# Altium schematic symbol library Hydra_Ref_sch.SCHLIB: 791 symbols (part 2 of 5) (continued)
## LSD0-05620
designator L?, comment value 6.2uH  (hidden comment: IND; 6.2uH;20%;4.96uH@2.43A;.023 OHM;PARALLEL;.39X.39X.195H)
MFGR: BH ELECTRONICS; NoLoad: .; Approved: CL; G_PN: LSD0-05620; M_PN: L11-1012; level: 1; ModifyDate: 5/2/13; item_number: LSD0-05620
footprint L11_BH ELECTRONICS (Footprint not found)
footprint L11_BH_ELECTRONICS
pins: 1 Pri+, 2 Pri-, 3 Sec-, 4 Sec+

## LSD0-05739
designator L?, comment value 7.39uH  (hidden comment: IND;7.39uH;20%;5.9uH@5.09A;.036 OHM;PARALLEL;.5X.5X.25H)
MFGR: BH ELECTRONICS; NoLoad: .; Approved: CL; G_PN: LSD0-05739; M_PN: L10-1012; level: 1; ModifyDate: 4/29/13; item_number: LSD0-05739
footprint L10_BH ELECTRONICS (Footprint not found)
footprint L10_BH_ELECTRONICS
pins: 1 Pri+, 2 Pri-, 3 Sec-, 4 Sec+

## LSD0-05848
designator L?, comment value 8.48uH  (hidden comment: IND;8.48uH;20%;6.8uH@4.75A;.019 OHM;PARALLEL; .5X.5X.25H)
MFGR: BH ELECTRONICS; NoLoad: .; Approved: CL; G_PN: LSD0-05848; M_PN: L01-0726; level: 1; ModifyDate: 5/1/13; item_number: LSD0-05848
footprint L10_BH ELECTRONICS (Footprint not found)
footprint L10_BH_ELECTRONICS
pins: 1 Pri+, 2 Pri-, 3 Sec-, 4 Sec+

## LSD0-05893
designator L?, comment value 8.93uH  (hidden comment: IND; 8.93uH;20%;7.14uH@2.03A;.034 OHM;PARALLEL;.39X.39X.195H)
MFGR: BH ELECTRONICS; NoLoad: .; Approved: CL; G_PN: LSD0-05893; M_PN: L11-1013; level: 1; ModifyDate: 4/29/13; item_number: LSD0-05893
footprint L11_BH ELECTRONICS (Footprint not found)
footprint L11_BH_ELECTRONICS
pins: 1 Pri+, 2 Pri-, 3 Sec-, 4 Sec+

## LSD0-05939
designator L?, comment value 59.39uH  (hidden comment: IND; 59.39uH;20%;47.51uH@1A;.623 OHM;PARALLEL;.305X.305X.15H)
MFGR: BH ELECTRONICS; NoLoad: .; Approved: CL; G_PN: LSD0-05939; M_PN: L16-1033; level: 1; ModifyDate: 5/8/13; item_number: LSD0-05939
footprint L16_BH ELECTRONICS (Footprint not found)
footprint L16_BH_ELECTRONICS
pins: 1 Pri+, 2 Pri-, 3 Sec-, 4 Sec+

## LSD0-05980
designator L?, comment value 9.8uH  (hidden comment: IND; 9.8uH;20%;7.84uH@2.47A;.102 OHM;PARALLEL;.305X.305X.15H)
MFGR: BH ELECTRONICS; NoLoad: .; Approved: CL; G_PN: LSD0-05980; M_PN: L16-1014; level: 1; ModifyDate: 4/30/13; item_number: LSD0-05980
footprint L16_BH ELECTRONICS (Footprint not found)
footprint L16_BH_ELECTRONICS
pins: 1 Pri+, 2 Pri-, 3 Sec-, 4 Sec+

## LSD0-07770
designator T?, comment CHOKE;CM;770UH;35%;4.7A;.04 DCR;3MHZ SRF;.67X.77 LCCI-50 SMT  (value not drawn)
Approved: FRANK; G_PN: LSD0-07770; M_PN: P0422NL; MFGR: Pulse Eng Inc.; level: 1; ModifyDate: 12/10/12; NoLoad: *; item_number: LSD0-07770
footprint IND-17.02X19.56-4P (ND-17.02X19.56-4P)
pins: 1, 2, 3, 4

## LSD2-06470
designator L?, comment value 47uH  (hidden comment: INDUCTOR;47UH;20%;3.0;.05 OHM;.669L X.701WX.441H;TOROID;SMT)
MFGR: AlphaMag; NoLoad: .; Approved: CL; G_PN: LSD2-06470; M_PN: SH50S-3.0-47; level: 1; ModifyDate: 5/2/12; item_number: LSD2-06470
footprint IND-SH50S (.135x.050 toroidan inductor G_PN 34345)
pins: 1, 2

## LSD2-06500
designator L?, comment value 50uH  (hidden comment: INDUCTOR;50UH;20%;1.65A;.121 OHM;.5L X.5WX.215H;TOROID;SMT)
MFGR: PULSE; NoLoad: .; Approved: CL; G_PN: LSD2-06500; M_PN: P0147NL; level: 1; ModifyDate: 5/2/12; item_number: LSD2-06500
footprint IND-P0147 (.500X.500x..215" toroidan inductor G_PN LSD2-06500)
pins: 1, 2

## LTP0-S0002
designator T?, comment M_PN: PA0805NL  (hidden comment: ANSFORMER;POWER;200KHZ-700KHZ;140W;SMT .92INX.85IN)
NoLoad: .; MFGR: Pulse Eng; Approved: NM; G_PN: LTP0-S0002; level: 1; ModifyDate: 10/24/12; item_number: LTP0-S0002
footprint XFMR-PA0808 (.920x.850x.339" 11Pins SMT Transformer -Pulse)
pins: 2 PriA+, 3 PriB+, 4 PriA-, 5 PriB-, 7 Sec+, 8 SecCT, 9 SecCT, 10 SecCT, 11 Sec-
text: 1T; PRI A; PRI B

## LTR0-00108
designator T?, comment G_PN: LTR0-00108  (hidden comment: XFMER; .1-130MHZ; Z 1:8; .31 X .22; SMT)
M_PN: ADT8-1T+; NoLoad: .; MFGR: MINICIRCUITS; Approved: CL; Value: ADT8-1T+; level: 1; ModifyDate: 4/11/12; item_number: LTR0-00108
footprint XFMR-CD637 (.220x.310x.206" 6Pins RF Transformer -Mini-Circuits)
pins: 1 Pri+, 3 Pri-, 4 Sec-, 5 SecCT, 6 Sec+

## LTR1-S0102
designator T?, comment G_PN: LTR1-S0102  (hidden comment: XFORMER;1:2Z CT;8-600 MHZ;1W;30MA;CD542 CASE)
M_PN: ADT2-1T-1P+; NoLoad: .; MFGR: MINICIRCUITS; Approved: NM; Value: ADT2-1T-1P+; level: 1; ModifyDate: 11/9/12; item_number: LTR1-S0102
footprint XFMR-CD542 (.220x.310x.212" 6Pins RF Transformer -Mini-Circuits)
pins: 1 Pri+, 3 Pri-, 4 Sec-, 5 SecCT, 6 Sec+

## LTR2-S0104
designator T?, comment G_PN: LTR2-S0104  (hidden comment: XFORMER;1:4Z CT;1.5-600 MHZ; .25W;30MA;DB714 CASE)
M_PN: TCM4-6T+; NoLoad: .; MFGR: MINICIRCUITS; Approved: CL; Value: TCM4-6T+; level: 1; ModifyDate: 2/25/13; item_number: LTR2-S0104
footprint CPLR-DB714 (.150x.160x.160" 6pin Derectional Coupler- Mini-Circuit)
pins: 1 Pri+, 2 SecCT, 3 Pri-, 4 Sec-, 6 Sec+

## LTR3-S0104
designator T?, comment G_PN: LTR3-S0104  (hidden comment: XFORMER;1:4Z CT;500-2500MHZ; .25W;30MA;.15INx.15IN)
M_PN: TC4-25+; NoLoad: .; MFGR: MINICIRCUITS; Approved: CL; Value: TC4-25+; level: 1; ModifyDate: 2/25/13; item_number: LTR3-S0104
footprint AT224-1 (Footprint not found)
pins: 1 Sec, 2 Sec CT, 3 Sec Dot, 4 Pri , 6 Pri Dot

## LTR4-S0104
designator T?, comment G_PN: LTR4-S0104  (hidden comment: XFORMER;1:4Z CT;2-800MHZ; .25W;240MA;.15INx.15IN)
M_PN: MABAES0061; NoLoad: .; MFGR: MACOM TECH; Approved: CL; Value: MABAES0061; level: 1; ModifyDate: 6/1/13; item_number: LTR4-S0104
footprint SM-22_Macomtech (SM-22 Package; 150 X 150 MIL)
pins: 1 Pri+, 2 SecCT, 3 Pri-, 4 Sec-, 5 Sec+

## MA08-20002
designator U?, comment M_PN: MSA-0505  (hidden comment: AMP;100-1500MHZ;7.5DB;+18DBM;8.4V;80MA;6.5DB NF;05 PKG)
NoLoad: .; Approved: CL; MFGR: AVAGO; G_PN: MA08-20002; level: 1; ModifyDate: 02/22/12; Value: MSA-0505; item_number: MA08-20002
footprint AMP-AVAGO-05 (05 Plastic Package - Avago)
pins: 1 IN, 2 GND, 3 OUT, 4 GND

## MA09-10002
designator U?, comment G_PN: MA09-10002  (hidden comment: AMP;100-1500MHZ;8.5DB;+23DBM;12V;165MA;6.5DB NF;.2 BeO PKG)
NoLoad: .; Approved: CL; MFGR: AVAGO; level: 1; M_PN: MSA-0520; ModifyDate: 02/22/12; Value: MSA-0520; item_number: MA09-10002
footprint AMP-AVAGO-200mil Be0-SMT (200mil Be0 Package Dimensions - Avago)
footprint AMP-AVAGO-200mil_Be0-SMT
pins: 1 IN, 2 GND, 3 OUT, 4 GND

## MA10-00004
designator U?, comment M_PN: RF3861  (hidden comment: P;.4-3.8GHZ;+22DBM;5V;90MA;QFN-16)
MFGR: RFMD; Approved: CL; G_PN: MA10-00004; Value: RF3861; NoLoad: .; level: 1; ModifyDate: 3/7/13; item_number: MA10-00004
footprint QFN-16_RFMD (QFN-16 RFMD)
pins: 1 NC, 2 NC, 3 RF IN, 4 NC, 5 NC, 6 NC, 7 AGC, 8 NC, 9 NC, 10 NC, 11 RF OUT, 12 NC, 13 NC, 14 NC, 15 NC, 16 NC, 17 GND

## MA12-10001
designator U?, comment G_PN: MA12-10001  (hidden comment: AMP;50-1000MHZ;12DB;+18DBM;5.5V;60MA;4.4DB NF;RRR137 PKG)
M_PN: MAV-11BSM+; NoLoad: .; Approved: CL; MFGR: MINI-CIRCUITS; Value: MAV-11BSM+; level: 1; ModifyDate: 5/24/13; item_number: MA12-10001
footprint RRR137
pins: 1 IN, 2 GND, 3 OUT, 4 GND

## MA13-06289
designator U?, comment M_PN: SGA6289Z  (hidden comment: AMP;0-4500MHZ;20DB;+13DBM;5V;75MA;4.0DB NF;SOT-89)
Value: SGA6289Z; NoLoad: .; Approved: CL; MFGR: RFMD; G_PN: MA13-06289; level: 1; ModifyDate: 2/28/13; item_number: MA13-06289
footprint SOT-89 (Pins 2 and 4 connected to GND)
pins: 1 IN, 2 GND, 3 OUT, 4 GND

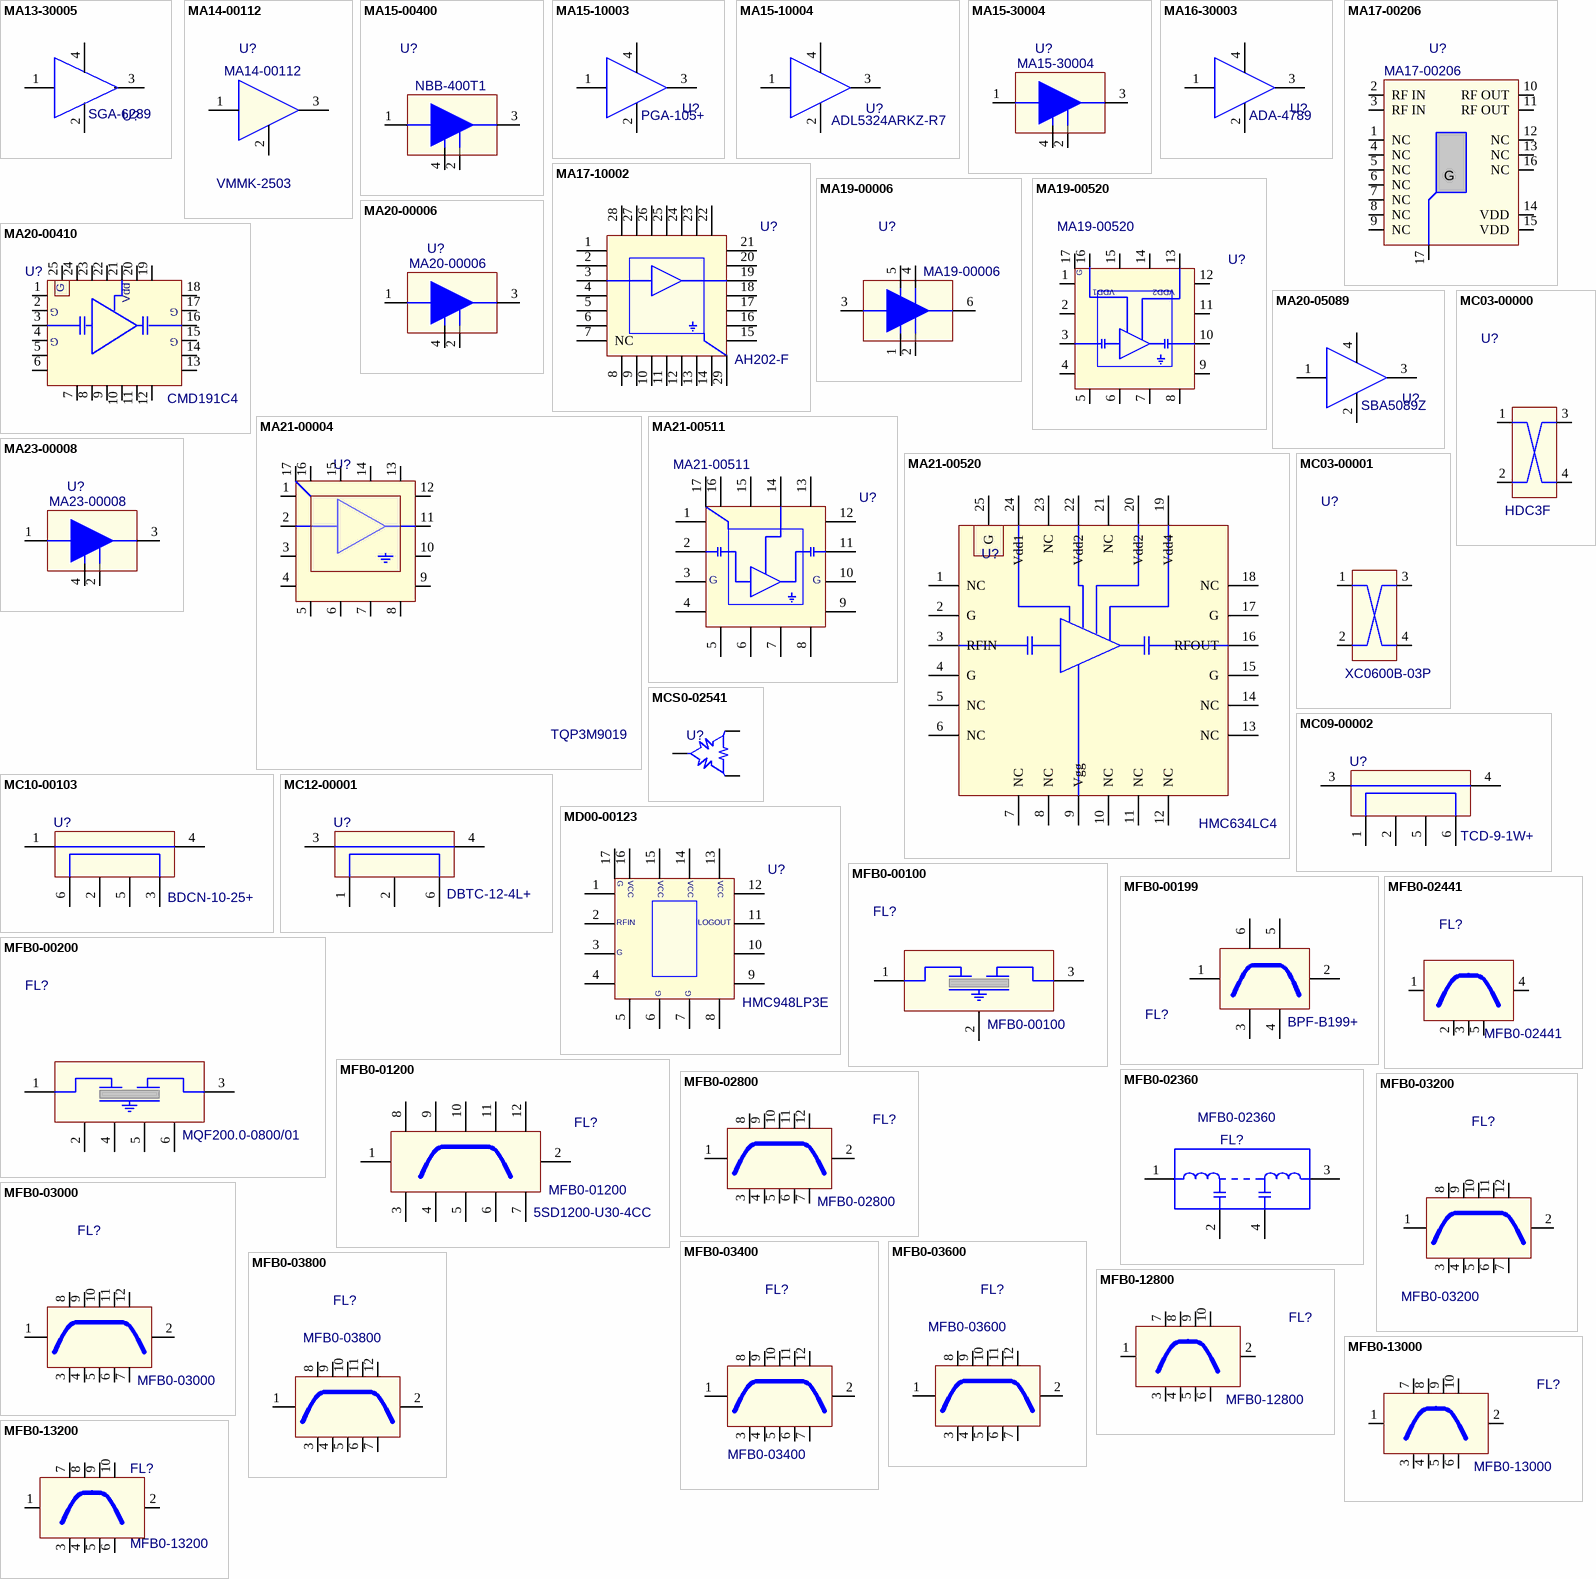
[diagram p8: symbols MA13-30005 to MFB0-13200]

## MA13-30005
designator U?, comment SGA-6289
AMP;0-5.5GHZ;16DB;+18DBM;75MA;SOT-89; G_PN: MA13-30005; NoLoad: .; Approved: CL; level: 1; Value: SGA-6289; ModifyDate: 4/11/12; M_PN: SGA-6289; item_number: MA13-30005
footprint SOT89L
pins: 1 IN, 2 GND, 3 OUT, 4 GND

## MA14-00112
designator U?, comment M_PN: VMMK-2503  G_PN: MA14-00112  (hidden comment: AMP;1-12GHz;13.5dB;+17dBm;5V;68mA;WLP-0402)
NoLoad: .; Approved: NM; MFGR: AVAGO; level: 1; ModifyDate: 11/28/12; item_number: MA14-00112
footprint AMP-VMMK-2503 (0.5x1.05x0.25mm)
pins: 1 IN, 2 GND, 3 OUT

## MA15-00400
designator U?, comment M_PN: NBB-400T1  (hidden comment: AMP;0-8000MHZ;15DB;+15DBM;3.9V;47MA;4.3DB NF;MICRO-X)
Approved: CL; G_PN: MA15-00400; MFGR: RFMD; Value: NBB-400T1; level: 1; ModifyDate: 3/9/13; item_number: MA15-00400
footprint AMP-NBB-400 (Check the PCB symbol when sample arive)
pins: 1, 2 GND, 3, 4

## MA15-10003
designator U?, comment M_PN: PGA-105+  (hidden comment: AMP.04-2.6GHZ;+19DBM;5V;63MA;SOT-89)
Value: PGA-105+; NoLoad: .; Approved: CL; MFGR: MINI-CIRCUITS; G_PN: MA15-10003; level: 1; ModifyDate: 10-22-13; item_number: MA15-10003
footprint SOT-89 (Pins 2 and 4 connected to GND)
pins: 1 IN, 2 GND, 3 OUT, 4 GND

## MA15-10004
designator U?, comment M_PN: ADL5324ARKZ-R7  (hidden comment: AMP;.4-4GHz;15dB;+29dBm;5V;133mA;SOT-89)
Value: ADL5324ARKZ-R7; NoLoad: .; Approved: CL; MFGR: ANALOG; G_PN: MA15-10004; level: 1; ModifyDate: 8/8/14; item_number: MA15-10004
footprint SOT-89 (Pins 2 and 4 connected to GND)
pins: 1 IN, 2 GND, 3 OUT, 4 GND

## MA15-30004
designator U?, comment G_PN: MA15-30004  (hidden comment: AMP;0-4GHZ;15DB;+24DBM;7.3V;120MA;SOT-89)
Approved: CL; MFGR: Triquint; NoLoad: .; Value: ECG008B-G; level: 1; ModifyDate: 3/30/16; M_PN: ECG008B-G; item_number: MA15-30004
footprint SOT-89 (Pins 2 and 4 connected to GND)
pins: 1, 2 GND, 3, 4

## MA16-30003
designator U?, comment M_PN: ADA-4789  (hidden comment: AMP;.01-2.5GHz;17DB;+17DBM;3.85V;60MA)
NoLoad: .; Approved: CL; MFGR: AVAGO; G_PN: MA16-30003; level: 1; Value: ADA-4789; ModifyDate: 4/12/12; item_number: MA16-30003
footprint SOT89L (SOT89, 3-Leads, Body 4.5x2.4 mm, Pitch 1.5mm, Lead Span 4.1mm, IPC High Density)
pins: 1 IN, 2 GND, 3 OUT, 4 GND

## MA17-00206
designator U?, comment G_PN: MA17-00206  (hidden comment: MMA-020624-L3)
AMP;2-6GHz;17DB;+25DBM;9V;250MA;LLC-17; MFGR: MICROWAVE TECH; NoLoad: .; Approved: NM; level: 1; Value: *; ModifyDate: 11/14/12; M_PN: MMA-020624-L3; item_number: MA17-00206
footprint QFN50P300x300x110-17N (QFN-16PIN-3MMx3MM_.5mm Pitch .8 mm tall Nominal footprint)
pins: 1 NC, 2 RF IN, 3 RF IN, 4 NC, 5 NC, 6 NC, 7 NC, 8 NC, 9 NC, 10 RF OUT, 11 RF OUT, 12 NC, 13 NC, 14 VDD, 15 VDD, 16 NC, 17 GND
text: G

## MA17-10002
designator U?, comment M_PN: AH202-F  (hidden comment: AMP;.05-2.2GHZ;+30DBM;11V;330MA;QFN-28 W/G)
MFGR: TRIQUINT; Approved: CL; G_PN: MA17-10002; Value: AHA202-F; NoLoad: .; level: 1; ModifyDate: 4/1/12; item_number: MA17-10002
footprint QFN65P600X600X100-29 (QFN, 28-Leads, Body 6.0x6.0mm (max), Pitch 0.65mm, TRIQUINT)
pins: 1 GND, 2 GND, 3 In, 4 GND, 5 GND, 6 GND, 7 NC, 8 GND, 9 GND, 10 GND, 11 GND, 12 GND, 13 GND, 14 GND, 15 GND, 16 GND, 17 GND, 18 GND, 19 GND, 20 GND, 21 GND, 22 GND, 23 GND, 24 GND, 25 GND, 26 GND, 27 GND, 28 GND, 29 GND

## MA19-00006
designator U?, comment G_PN: MA19-00006  (hidden comment: AMP;0-6GHZ;19.6DB;+12.9DBM;5V;SOT-363)
Approved: CL; MFGR: AVAGO; NoLoad: .; Value: AVT-51663; level: 1; ModifyDate: 3/6/13; M_PN: AVT-51663; item_number: MA19-00006
footprint SOT-363 (JEDEC MO-203AB)
pins: 1  , 2  , 3  , 4  , 5  , 6   

## MA19-00520
designator U?, comment G_PN: MA19-00520  (hidden comment: AMP;5-11GHz;21dB;+19dBm;5V;114mA;LC3)
MFGR: HITTITE; Approved: CL; Value: HMC451LC3; NoLoad: .; level: 1; ModifyDate: 1/25/13; M_PN: HMC451LC3; item_number: MA19-00520
footprint QFN-16_HITTITE_LC3_036 (LC3 – 3 x 3 mm QFN CERAMIC  HIGH FREQUENCY SMT PACKAGE, 36mil height)
pins: 1 NC, 2 NC, 3 RF IN, 4 NC, 5 NC, 6 NC, 7 NC, 8 NC, 9 NC, 10 RF OUT, 11 NC, 12 NC, 13 VDD2, 14 NC, 15 NC, 16 VDD1, 17 GND
text: G

## MA20-00006
designator U?, comment G_PN: MA20-00006  (hidden comment: AMP;0-6GHZ;20DB;+20DBM;5V;100MA;SOT-89)
Approved: CL; MFGR: SKYWORKS; NoLoad: .; Value: SKY65017-70LF; level: 1; ModifyDate: 6/26/14; M_PN: SKY65017-70LF; item_number: MA20-00006
footprint SOT-89 (Pins 2 and 4 connected to GND)
pins: 1, 2 GND, 3, 4

## MA20-00410
designator U?, comment M_PN: CMD191C4  (hidden comment: AMP;.4-10GHZ ;+20DBM;5V;123MA;QFN-24)
Value: CMD191C4; NoLoad: .; Approved: CL; MFGR: CUSTOM MMIC; G_PN: MA20-00410; level: 1; ModifyDate: 1/15/14; item_number: MA20-00410
footprint QFN-24_C-MMIC (Footprint not found)
pins: 1 NC, 2 G, 3 RFIN, 4 G, 5 NC, 6 NC, 7 NC, 8 NC, 9 NC, 10 NC, 11 NC, 12 NC, 13 NC, 14 NC, 15 G, 16 RFOUT, 17 G, 18 NC, 19 NC, 20 NC, 21 Vdd, 22 NC, 23 NC, 24 NC, 25 G

## MA20-05089
designator U?, comment M_PN: SBA5089Z  (hidden comment: AMP;0-5000MHZ;20DB;+19.5DBM;5V;80MA;4.5DB NF;SOT-89)
Value: SBA5089Z; NoLoad: .; Approved: CL; MFGR: RFMD; G_PN: MA20-05089; level: 1; ModifyDate: 2/28/13; item_number: MA20-05089
footprint SOT-89 (Pins 2 and 4 connected to GND)
pins: 1 IN, 2 GND, 3 OUT, 4 GND

## MA21-00004
designator U?, comment M_PN: TQP3M9019  (hidden comment: AMP;.05-4GHz;21dB;+22dBm;5V;150mA;QFN16)
Value: TQP3M9019; NoLoad: .; Approved: CL; MFGR: TRIQUINT; G_PN: MA21-00004; level: 1; ModifyDate: 3/11/13; item_number: MA21-00004
footprint QFN-16_TRIQUINT (QFN-16 TRIQUINT)
pins: 1 NC, 2 RFIN, 3 NC, 4 NC, 5 NC, 6 NC, 7 NC, 8 NC, 9 NC, 10 NC, 11 RFOUT, 12 NC, 13 NC, 14 NC, 15 NC, 16 NC, 17 G

## MA21-00511
designator U?, comment G_PN: MA21-00511  (hidden comment: AMP;5-11GHz;21dB;+10dBm;3.6V;30mA;QFN-16)
MFGR: CUSTOM MMIC; Approved: CL; Value: CMD132P3; NoLoad: .; level: 1; ModifyDate: 6/6/13; M_PN: CMD132P3; item_number: MA21-00511
footprint QFN-16_C-MMIC (QFN-16 C-MMIC)
pins: 1 NC, 2 RF IN, 3 GND, 4 NC, 5 NC, 6 NC, 7 NC, 8 NC, 9 NC, 10 GND, 11 RF OUT, 12 NC, 13 NC, 14 Vdd, 15 NC, 16 NC, 17 GND
text: G

## MA21-00520
designator U?, comment M_PN: HMC634LC4  (hidden comment: AMP;5-20GHz;21dB;+22dBm;5V;180mA;QFN24)
Value: HMC634LC4; NoLoad: .; Approved: CL; MFGR: HITTITE; G_PN: MA21-00520; level: 1; ModifyDate: 2/26/13; item_number: MA21-00520
footprint LC4_HITTITE (QFN Plastic Package 157X157X40(mil))
pins: 1 NC, 2 G, 3 RFIN, 4 G, 5 NC, 6 NC, 7 NC, 8 NC, 9 Vgg, 10 NC, 11 NC, 12 NC, 13 NC, 14 NC, 15 G, 16 RFOUT, 17 G, 18 NC, 19 Vdd4, 20 Vdd2, 21 NC, 22 Vdd2, 23 NC, 24 Vdd1, 25 G

## MA23-00008
designator U?, comment G_PN: MA23-00008  (hidden comment: AMP;0-8GHZ;23DB;+18DBM;5V;70MA;SOT-89)
Approved: NM; MFGR: MIMIX BROADBAND; NoLoad: .; Value: CGB7017-SC; level: 1; ModifyDate: 11/14/12; M_PN: CGB7017-SC; item_number: MA23-00008
footprint SOT-89 (Pins 2 and 4 connected to GND)
pins: 1, 2 GND, 3, 4

## MC03-00000
designator U?, comment M_PN: HDC3F  (hidden comment: COUPLER;3DB;90 DEG;380-520 MHZ;3.6DB LOSS;56INx.35IN SMT CASE)
MFGR: ANAREN; NoLoad: .; Approved: CL; Value: HDC3F; G_PN: MC03-00000; level: 1; ModifyDate: 3/15/13; item_number: MC03-00000
footprint HDC3F (Footprint not found)
pins: 1  , 2  , 3  , 4  

## MC03-00001
designator U?, comment M_PN: XC0600B-03P  (hidden comment: COUPLER;3DB;90 DEG;250-1000 MHZ;3.6DB LOSS;1INx.5IN SMT CASE)
MFGR: ANAREN; NoLoad: .; Approved: CL; Value: XC0600B-03P; G_PN: MC03-00001; level: 1; ModifyDate: 3/12/13; item_number: MC03-00001
footprint XC0600B-03P (Footprint not found)
pins: 1  , 2  , 3  , 4  

## MC09-00002
designator U?, comment M_PN: TCD-9-1W+  (hidden comment: COUPLER;8.9DB;5-2000 MHZ;1.2DB LOSS;DB714 SMT CASE)
MFGR: MINI_CIRCUITS; NoLoad: .; Approved: CL; Value: TCD-9-1W+; G_PN: MC09-00002; level: 1; ModifyDate: 5/18/12; item_number: MC09-00002
footprint CPLR-DB714 (.150x.160x.160" 6pin Derectional Coupler- Mini-Circuit)
pins: 1, 2, 3, 4, 5, 6

## MC10-00103
designator U?, comment M_PN: BDCN-10-25+  (hidden comment: COUPLER;10DB;820-2525 MHZ;1.5DB LOSS;FV1206-1 SMT CASE)
MFGR: MINI_CIRCUITS; NoLoad: .; Approved: CL; Value: BDCN-10-25+; G_PN: MC10-00103; level: 1; ModifyDate: 5/24/13; item_number: MC10-00103
footprint FV1206-1-PS (MINI-CIRCUITS FV1206-1 Power Splitter)
pins: 1 INPUT, 2 GND, 3 CPV (REV), 4 OUTPUT, 5 GND, 6 CPL (FWD)

## MC12-00001
designator U?, comment M_PN: DBTC-12-4L+  (hidden comment: COUPLER;12.2DB;5-1000 MHZ;33DB DIR;0.7DB LOSS;AT71030 CASE      Owner    Tony Ferro)
MFGR: MINI_CIRCUITS; NoLoad: .; Approved: CL; Value: DBTC-12-4L+; G_PN: MC12-00001; level: 1; ModifyDate: 5/18/12; item_number: MC12-00001
footprint CPLR-AT1030 (.150x.166x.150" 5pin Derectional Coupler- Mini-Circuit)
pins: 1 CPL, 2 GND, 3 IN, 4 OUT, 6 ISO

## MCS0-02541
designator U?, comment RESISTIVE SPLITTER;6 DB;+/-.5DB;0-20 GHZ;.098x.098x.020  (value not drawn)
G_PN: MCS0-02541; NoLoad: .; MFGR: ANY; M_PN: IPS2541-C; Approved: CL; Value: IPS2541-C; level: 1; ModifyDate: 2/27/13; item_number: MCS0-02541
footprint RES SPLITTER (IPS2541; 98 X98 MIL)
footprint RES_SPLITTER
pins: 1, 2, 3

## MD00-00123
designator U?, comment M_PN: HMC948LP3E  (hidden comment: LOG DETECTOR;1-23 GHz;54dB DYNAMIC RANGE;3x3 mm SMT)
MFGR: HITTITE; Approved: CL; G_PN: MD00-00123; Value: HMC948LP3E; NoLoad: .; level: 1; ModifyDate: 4/26/13; item_number: MD00-00123
footprint QFN-16_HITTITE_LP3 (QFN-16 HITTITE)
pins: 1 NC, 2 RFIN, 3 G, 4 NC, 5 NC, 6 G, 7 G, 8 NC, 9 NC, 10 NC, 11 LOGOUT, 12 NC, 13 VCC, 14 VCC, 15 NC, 16 VCC, 17 GND

## MFB0-00100
designator FL?, comment G_PN: MFB0-00100  (hidden comment: FILTER;BAND PASS;XTAL;100 MHZ;1.7 KHZ BW;3-PIN GH9 METAL CASE)
M_PN: MQF100.0-0340/01; MFGR: VECTRON; NoLoad: .; Approved: CL; Value: MQF100.0-0340/01; level: 1; ModifyDate: 4/23/12; item_number: MFB0-00100
footprint FIL-MFQ100.0-0340 (TH, leads cut and bent and mounted as SM part, Comb Generator)
pins: 1 IN, 2 GND, 3 OUT

## MFB0-00199
designator FL?, comment M_PN: BPF-B199+  (hidden comment: FILTER;BAND PASS;199MHZ CF;10MHZ BW;HZ1198)
MFGR: MINI-CIRCUITS; Approved: CL; NoLoad: .; Value: BPF-B199+; G_PN: MFB0-00199; level: 1; ModifyDate: 02/22/12; item_number: MFB0-00199
footprint FIL-HZ1198 (CASE STYLE HZ1198 -Mini-Circuit)
footprint FIL-HZ1198 4-GND PINS (CASE STYLE HZ1198 -Mini-Circuit, All GND pins isolated with solder mask)
pins: 1 IN, 2 OUT, 3 GND, 4 GND, 5 GND, 6 GND

## MFB0-00200
designator FL?, comment M_PN: MQF200.0-0800/01  (hidden comment: FILTER;BAND PASS;XTAL;200 MHZ;4.0 KHZ BW;6-PAD SMT GS2 PACKAGE)
MFGR: VECTRON; NoLoad: .; Approved: CL; Value: MQF200.0-0800/01; G_PN: MFB0-00200; level: 1; ModifyDate: 4/23/12; item_number: MFB0-00200
footprint FIL-5.0x7.0x1.4_2+4P
footprint FIL-5.0x7.0x1.4_2+4P-GND ISOLATED (All pins isolated with solder mask)
footprint FIL-5.0x7.0x1.4_2_4P
pins: 1 IN, 2 GND, 3 OUT, 4 GND, 5 GND, 6

## MFB0-01200
designator FL?, comment M_PN: 5SD1200-U30-4CC  G_PN: MFB0-01200  (hidden comment: FILTER;CER;BANDPASS;1200MHZ;30MHZ BW;4-SEC;SMT)
MFGR: LARK ENGINEERING; Approved: CL; NoLoad: .; Value: 5SD1200-U30-4CC; level: 1; ModifyDate: 4/23/12; item_number: MFB0-01200
footprint FIL-5SD1200-U30-4CC
pins: 1, 2, 3, 4, 5, 6, 7, 8, 9, 10, 11, 12

## MFB0-02360
designator FL?, comment G_PN: MFB0-02360  (hidden comment: 2360 MHZ BANDPASS FILTER 220 MHZ BW;3.2X1.3mm;FV1206;4 PIN)
MFGR: MINI-CIRCUITS; Approved: NM; Value: BFCN-2360+; NoLoad: .; level: 1; ModifyDate: 12/04/12; M_PN: BFCN-2360+; item_number: MFB0-02360
footprint FV1206 (FV1206 Mini-Circuits)
pins: 1 IN, 2 GND, 3 OUT, 4 GND

## MFB0-02441
designator FL?, comment G_PN: MFB0-02441  (hidden comment: MICROSTRIP BPF, 3 TO 4.2 GHz)  (net tie, no BOM)
Approved: CL; MFGR: Epcos; NoLoad: .; M_PN: B39242B9413K610; Value: B39242B9413K610; level: 1; ModifyDate: 7/1/14; item_number: MFB0-02441
footprint B9413 (Epcos SAW Filter)
pins: 1 IN, 2 GND, 3 GND, 4 OUT, 5 GND
1 alternate drawing of the same symbol

## MFB0-02800
designator FL?, comment G_PN: MFB0-02800  (hidden comment: FILTER;CER;BANDPASS;2800MHZ;200MHZ BW;6-SEC;SMT)
Approved: CL; MFGR: LARK ENGINEERING; NoLoad: .; Value: 4SD2800-U200-6CC; level: 1; ModifyDate: 4/8/13; M_PN: 4SD2800-U200-6CC; item_number: MFB0-02800
footprint FIL-1060x500x240-2+10P
footprint FIL-1060x500x240_2+10P
footprint FIL-1060x500x240_2_10P
pins: 1, 2, 3, 4, 5, 6, 7, 8, 9, 10, 11, 12
1 alternate drawing of the same symbol

## MFB0-03000
designator FL?, comment G_PN: MFB0-03000  (hidden comment: FILTER;CER;BANDPASS;3000MHZ;200MHZ BW;6-SEC;SMT)
MFGR: LARK ENGINEERING; NoLoad: .; Value: 4SD3000-U200-6CC; level: 1; ModifyDate: 3/8/13; M_PN: 4SD3000-U200-6CC; item_number: MFB0-03000
footprint FIL-1060x380x240_2+10P (Lark part # 4SD3600-U200-6CC)
footprint FIL-1060X380X240_2_10P
pins: 1, 2, 3, 4, 5, 6, 7, 8, 9, 10, 11, 12
1 alternate drawing of the same symbol

## MFB0-03200
designator FL?, comment G_PN: MFB0-03200  (hidden comment: FILTER;CER;BANDPASS;3200MHZ;200MHZ BW;6-SEC;SMT)
Approved: CL; MFGR: Lark Engineering; NoLoad: .; Value: 4SD3200-U200-6CC; level: 1; ModifyDate: 4/8/13; M_PN: 4SD3200-U200-6CC; item_number: MFB0-03200
footprint FIL-1060x380x240_2+10P (Lark part # 4SD3600-U200-6CC)
footprint FIL-1060X380X240_2_10P
pins: 1, 2, 3, 4, 5, 6, 7, 8, 9, 10, 11, 12
1 alternate drawing of the same symbol

## MFB0-03400
designator FL?, comment G_PN: MFB0-03400  (hidden comment: 4SD3400-U200-6CC)
FILTER;CER;BANDPASS;3400MHZ;200MHZ BW;6-SEC;SMT; Approved: CL; MFGR: LARK ENGINEERING; NoLoad: .; level: 1; ModifyDate: 4/8/13; Value: 4SD3400-U200-6CC; M_PN: 4SD3400-U200-6CC; item_number: MFB0-03400
footprint FIL-1060x380x240_2+10P (Lark part # 4SD3600-U200-6CC)
footprint FIL-1060X380X240_2_10P
pins: 1, 2, 3, 4, 5, 6, 7, 8, 9, 10, 11, 12
1 alternate drawing of the same symbol

## MFB0-03600
designator FL?, comment G_PN: MFB0-03600  (hidden comment: TER;CER;BANDPASS;3600MHZ;200MHZ BW;6-SEC;SMT)
Approved: CL; NoLoad: .; Value: 4SD3600-U200-6CC; MFGR: LARK ENGINEERING; level: 1; ModifyDate: 4/8/13; M_PN: 4SD3600-U200-6CC; item_number: MFB0-03600
footprint FIL-1060x380x240_2+10P (Lark part # 4SD3600-U200-6CC)
footprint FIL-1060X380X240_2_10P
pins: 1, 2, 3, 4, 5, 6, 7, 8, 9, 10, 11, 12
1 alternate drawing of the same symbol

## MFB0-03800
designator FL?, comment G_PN: MFB0-03800  (hidden comment: FILTER;CER;BANDPASS;3600MHZ;200MHZ BW;6-SEC;SMT)
Approved: CL; NoLoad: .; Value: 4SD3800-U200-6CC; MFGR: LARK ENGINEERING; level: 1; ModifyDate: 4/8/13; M_PN: 4SD3800-U200-6CC; item_number: MFB0-03800
footprint FIL-1060x380x240_2+10P (Lark part # 4SD3600-U200-6CC)
footprint FIL-1060X380X240_2_10P
pins: 1, 2, 3, 4, 5, 6, 7, 8, 9, 10, 11, 12
1 alternate drawing of the same symbol

## MFB0-12800
designator FL?, comment G_PN: MFB0-12800  (hidden comment: FILTER;CER;BANDPASS;2800MHZ;200MHZ BW;6-SEC;SMT)
Approved: CL; MFGR: IMC; NoLoad: .; Value: 940681; level: 1; ModifyDate: 5/30/13; M_PN: 940681; item_number: MFB0-12800
footprint S11H_IMC (Footprint not found)
pins: 1 IN, 2 OUT, 3 GND, 4 GND, 5 GND, 6 GND, 7 GND, 8 GND, 9 GND, 10 GND
1 alternate drawing of the same symbol

## MFB0-13000
designator FL?, comment G_PN: MFB0-13000  (hidden comment: FILTER;CER;BANDPASS;2800MHZ;200MHZ BW;6-SEC;SMT)
Approved: CL; MFGR: IMC; NoLoad: .; Value: 940682; level: 1; ModifyDate: 5/30/13; M_PN: 940682; item_number: MFB0-13000
footprint S11H_IMC (Footprint not found)
pins: 1 IN, 2 OUT, 3 GND, 4 GND, 5 GND, 6 GND, 7 GND, 8 GND, 9 GND, 10 GND
1 alternate drawing of the same symbol

## MFB0-13200
designator FL?, comment G_PN: MFB0-13200  (hidden comment: FILTER;CER;BANDPASS;3200MHZ;200MHZ BW;6-SEC;SMT)
Approved: CL; MFGR: IMC; NoLoad: .; Value: 940683; level: 1; ModifyDate: 5/30/13; M_PN: 940683; item_number: MFB0-13200
footprint S11H_IMC (Footprint not found)
pins: 1 IN, 2 OUT, 3 GND, 4 GND, 5 GND, 6 GND, 7 GND, 8 GND, 9 GND, 10 GND
1 alternate drawing of the same symbol

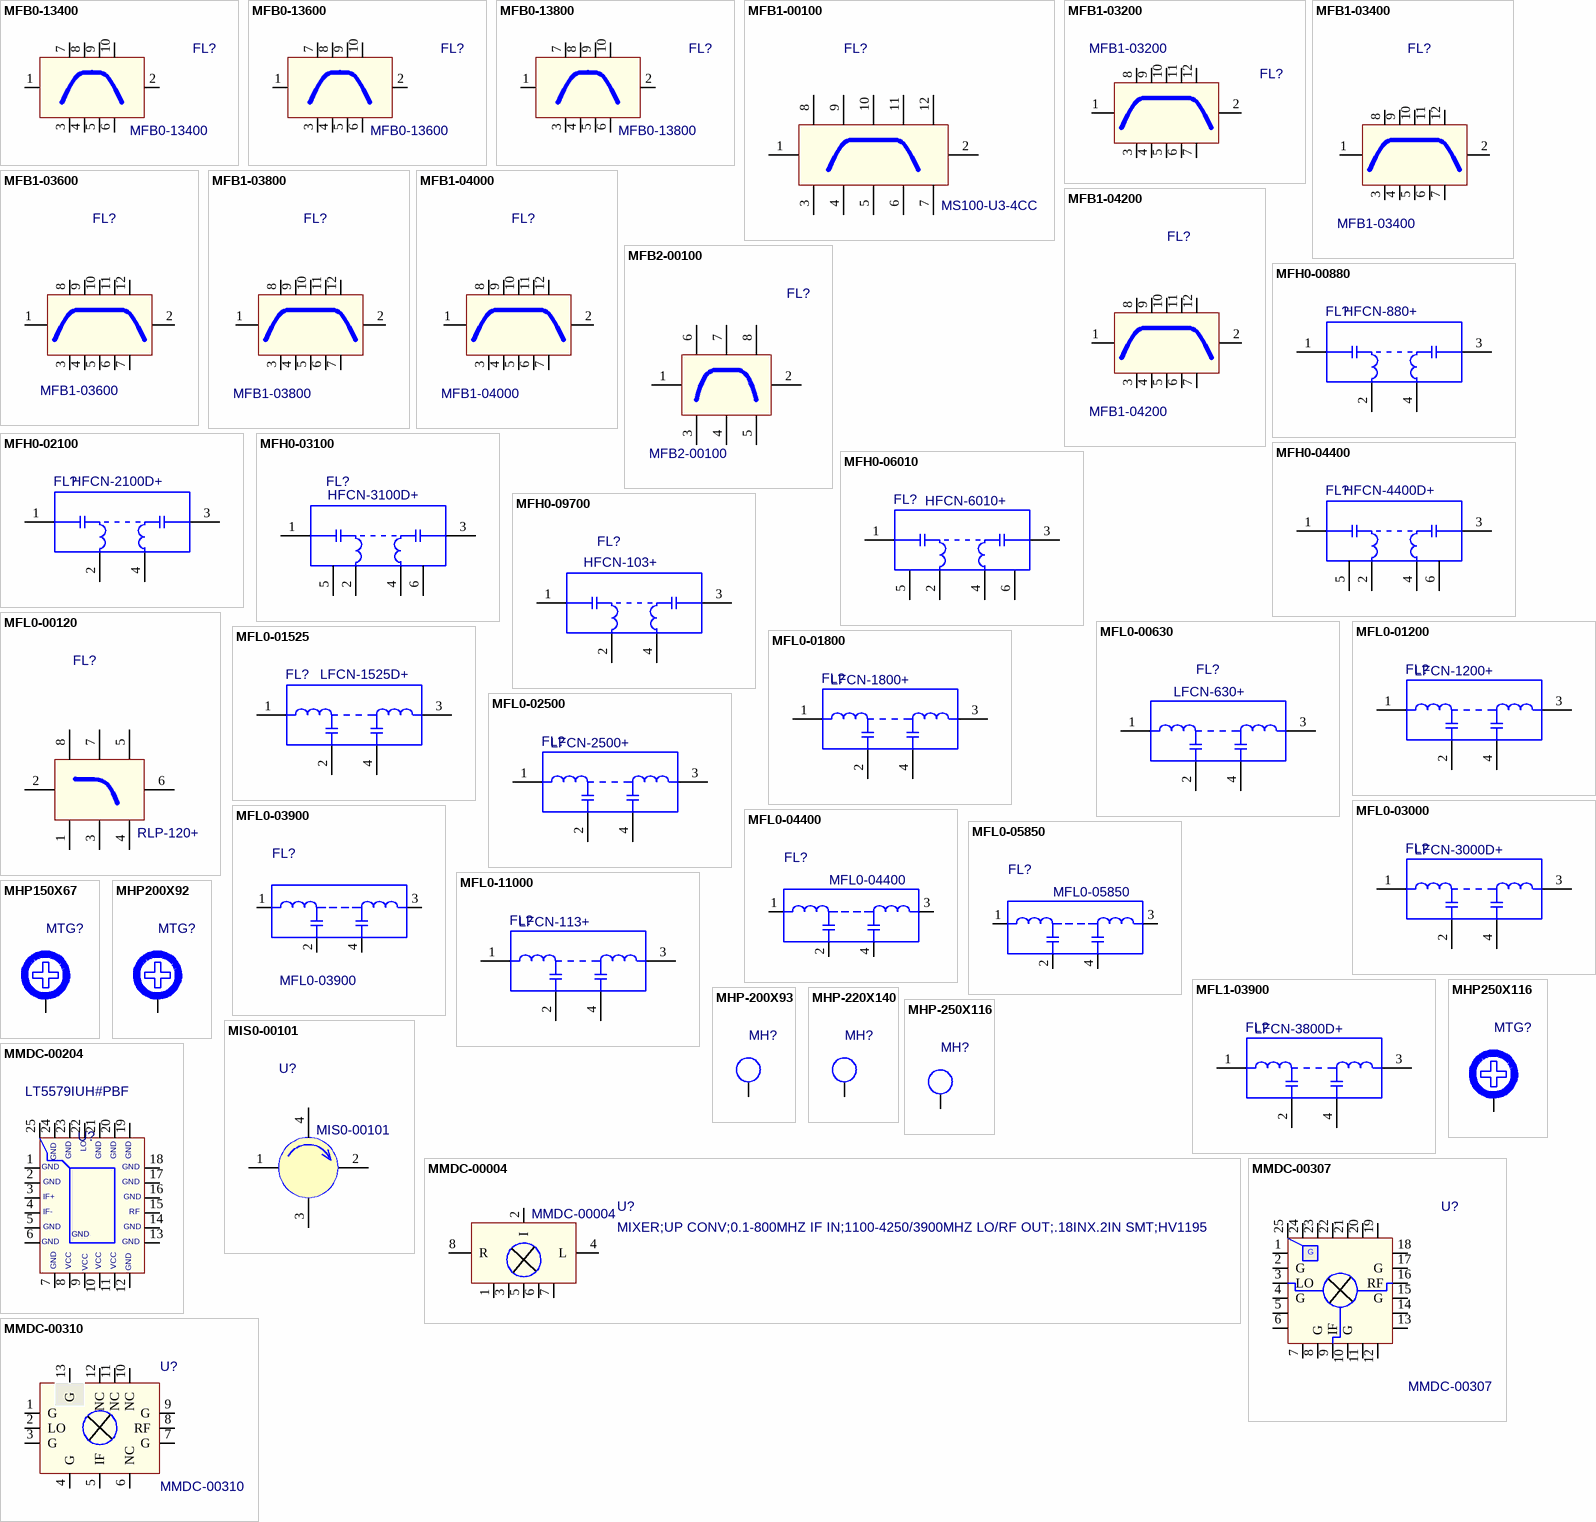
[diagram p9: symbols MFB0-13400 to MMDC-00310]

## MFB0-13400
designator FL?, comment G_PN: MFB0-13400  (hidden comment: FILTER;CER;BANDPASS;3400MHZ;200MHZ BW;6-SEC;SMT)
Approved: CL; MFGR: IMC; NoLoad: .; Value: 940684; level: 1; ModifyDate: 5/30/13; M_PN: 940684; item_number: MFB0-13400
footprint S11H_IMC (Footprint not found)
pins: 1 IN, 2 OUT, 3 GND, 4 GND, 5 GND, 6 GND, 7 GND, 8 GND, 9 GND, 10 GND
1 alternate drawing of the same symbol

## MFB0-13600
designator FL?, comment G_PN: MFB0-13600  (hidden comment: FILTER;CER;BANDPASS;3600MHZ;200MHZ BW;6-SEC;SMT)
Approved: CL; MFGR: IMC; NoLoad: .; Value: 940685; level: 1; ModifyDate: 5/30/13; M_PN: 940685; item_number: MFB0-13600
footprint S11H_IMC (Footprint not found)
pins: 1 IN, 2 OUT, 3 GND, 4 GND, 5 GND, 6 GND, 7 GND, 8 GND, 9 GND, 10 GND
1 alternate drawing of the same symbol

## MFB0-13800
designator FL?, comment G_PN: MFB0-13800  (hidden comment: FILTER;CER;BANDPASS;3800MHZ;200MHZ BW;6-SEC;SMT)
Approved: CL; MFGR: IMC; NoLoad: .; Value: 940686; level: 1; ModifyDate: 5/30/13; M_PN: 940686; item_number: MFB0-13800
footprint S11H_IMC (Footprint not found)
pins: 1 IN, 2 OUT, 3 GND, 4 GND, 5 GND, 6 GND, 7 GND, 8 GND, 9 GND, 10 GND
1 alternate drawing of the same symbol

## MFB1-00100
designator FL?, comment M_PN: MS100-U3-4CC  (hidden comment: FILTER;BAND PASS;100MHZ;3 MHZ BW;4 SEC;1X.5X.35 SMT)
MFGR: LARK ENGINEERING; Approved: CL; NoLoad: .; Value: MS100-U3-4CC; G_PN: MFB1-00100; level: 1; ModifyDate: 4/23/12; item_number: MFB1-00100
footprint FIL-1000x500x350_2+10P
footprint FIL-1000x500x350_2+10P-GND ISOLATED (All pins isolated with solder mask)
footprint FIL-1000x500x350_2_10P
pins: 1, 2, 3, 4, 5, 6, 7, 8, 9, 10, 11, 12

## MFB1-03200
designator FL?, comment G_PN: MFB1-03200  (hidden comment: FILTER;CER;BANDPASS;3200MHZ;70MHZ BW;6-SEC;SMT)
Approved: CL; MFGR: LARK ENGINEERING; NoLoad: .; Value: 4SD3200-U70-6CC; level: 1; ModifyDate: 4/8/13; M_PN: 4SD3200-U70-6CC; item_number: MFB1-03200
footprint FIL-1060X380X240_2_10P (Lark part # 4SD3600-U200-6CC)
pins: 1, 2, 3, 4, 5, 6, 7, 8, 9, 10, 11, 12
1 alternate drawing of the same symbol

## MFB1-03400
designator FL?, comment G_PN: MFB1-03400  (hidden comment: FILTER;CER;BANDPASS;3400MHZ;70MHZ BW;6-SEC;SMT)
Approved: CL; MFGR: LARK ENGINEERING; NoLoad: .; Value: 4SD3400-U70-6CC; level: 1; ModifyDate: 4/8/13; M_PN: 4SD3400-U70-6CC; item_number: MFB1-03400
footprint FIL-1060X380X240_2_10P (Lark part # 4SD3600-U200-6CC)
pins: 1, 2, 3, 4, 5, 6, 7, 8, 9, 10, 11, 12
1 alternate drawing of the same symbol

## MFB1-03600
designator FL?, comment G_PN: MFB1-03600  (hidden comment: 4SD3600-U70-6CC)
FILTER;CER;BANDPASS;3600MHZ;70MHZ BW;6-SEC;SMT; Approved: CL; MFGR: LARK ENGINEERING; NoLoad: .; level: 1; ModifyDate: 4/8/13; Value: 4SD3600-U70-6CC; M_PN: 4SD3600-U70-6CC; item_number: MFB1-03600
footprint FIL-1060X380X240_2_10P (Lark part # 4SD3600-U200-6CC)
pins: 1, 2, 3, 4, 5, 6, 7, 8, 9, 10, 11, 12
1 alternate drawing of the same symbol

## MFB1-03800
designator FL?, comment G_PN: MFB1-03800  (hidden comment: FILTER;CER;BANDPASS;3800MHZ;70MHZ BW;6-SEC;SMT)
Approved: CL; MFGR: LARK ENGINEERING; NoLoad: .; Value: 4SD3800-U70-6CC; level: 1; ModifyDate: 4/8/13; M_PN: 4SD3800-U70-6CC; item_number: MFB1-03800
footprint FIL-1060X380X240_2_10P (Lark part # 4SD3600-U200-6CC)
pins: 1, 2, 3, 4, 5, 6, 7, 8, 9, 10, 11, 12
1 alternate drawing of the same symbol

## MFB1-04000
designator FL?, comment G_PN: MFB1-04000  (hidden comment: FILTER;CER;BANDPASS;4000MHZ;70MHZ BW;6-SEC;SMT)
Approved: CL; MFGR: LARK ENGINEERING; NoLoad: .; Value: 4SD4000-U70-6CC; level: 1; ModifyDate: 4/8/13; M_PN: 4SD4000-U70-6CC; item_number: MFB1-04000
footprint FIL-1060X380X240_2_10P (Lark part # 4SD3600-U200-6CC)
pins: 1, 2, 3, 4, 5, 6, 7, 8, 9, 10, 11, 12
1 alternate drawing of the same symbol

## MFB1-04200
designator FL?, comment G_PN: MFB1-04200  (hidden comment: FILTER;CER;BANDPASS;4200MHZ;70MHZ BW;6-SEC;SMT)
Approved: CL; MFGR: LARK ENGINEERING; NoLoad: .; Value: 4SD4200-U70-6CC; level: 1; ModifyDate: 4/8/13; M_PN: 4SD4200-U70-6CC; item_number: MFB1-04200
footprint FIL-1060X380X240_2_10P (Lark part # 4SD3600-U200-6CC)
pins: 1, 2, 3, 4, 5, 6, 7, 8, 9, 10, 11, 12
1 alternate drawing of the same symbol

## MFB2-00100
designator FL?, comment G_PN: MFB2-00100  (hidden comment: FILTER;BAND PASS;100MHZ;7 MHZ BW;3 SEC;.5X.5X.35 SMT)
MFGR: LARK ENGINEERING; Approved: CL; NoLoad: .; Value: MS100-U7-3CC; level: 1; ModifyDate: 4/23/12; M_PN: MS100-U7-3CC; item_number: MFB2-00100
footprint FIL-500x500x350_2+6P
footprint FIL-500x500x350_2_6P
pins: 1, 2, 3, 4, 5, 6, 7, 8

## MFH0-00880
designator FL?, comment M_PN: HFCN-880+  (hidden comment: FILTER;HI PASS;880MHz;7SEC;FV1206;RoHS)
MFGR: MINI-CIRCUITS; G_PN: MFH0-00880; Approved: CL; Value: HFCN-880+; NoLoad: .; level: 1; ModifyDate: 7/5/12; item_number: MFH0-00880
footprint FV1206 (FV1206 Mini-Circuits)
pins: 1 IN, 2 GND, 3 OUT, 4 GND

## MFH0-02100
designator FL?, comment M_PN: HFCN-2100D+  (hidden comment: FILTER;HI PASS;2100MHz;7SEC;FV1206;RoHS)
MFGR: MINI-CIRCUITS; G_PN: MFH0-02100; Approved: CL; Value: HFCN-2100D+; NoLoad: .; level: 1; ModifyDate: 3/14/13; item_number: MFH0-02100
footprint FV1206 (Footprint not found)
pins: 1 IN, 2 GND, 3 OUT, 4 GND

## MFH0-03100
designator FL?, comment M_PN: HFCN-3100D+  (hidden comment: FILTER;HI PASS;3100MHz;5SEC;FV1206-1;RoHS)
MFGR: MINI-CIRCUITS; G_PN: MFH0-03100; Approved: CL; Value: HFCN-3100D+; NoLoad: .; level: 1; ModifyDate: 4/2/13; item_number: MFH0-03100
footprint FV1206-1 (MINI-CIRCUITS FV1206-1)
pins: 1 IN, 2 GND, 3 OUT, 4 GND, 5 GND, 6 GND

## MFH0-04400
designator FL?, comment M_PN: HFCN-4400D+  (hidden comment: FILTER;HI PASS;4400MHz;5SEC;FV1206-1;RoHS)
MFGR: MINI-CIRCUITS; G_PN: MFH0-04400; Approved: CL; Value: HFCN-4400D+; NoLoad: .; level: 1; ModifyDate: 3/14/13; item_number: MFH0-04400
footprint FV1206-1 (Footprint not found)
pins: 1 IN, 2 GND, 3 OUT, 4 GND, 5 GND, 6 GND